# Altium footprint library HoangLong_Library.PcbLib: 81 footprints (part 2 of 6)
Each footprint in its own frame and in the unit in brackets; x right, y up, seen from the top. Pads: shape width x height; smd on the part's side, far side on the other; paste and mask are expansions set on the pad; w line width, h text height; cw(c..) or ccw(c..) is an arc to the next point about the centre after c.
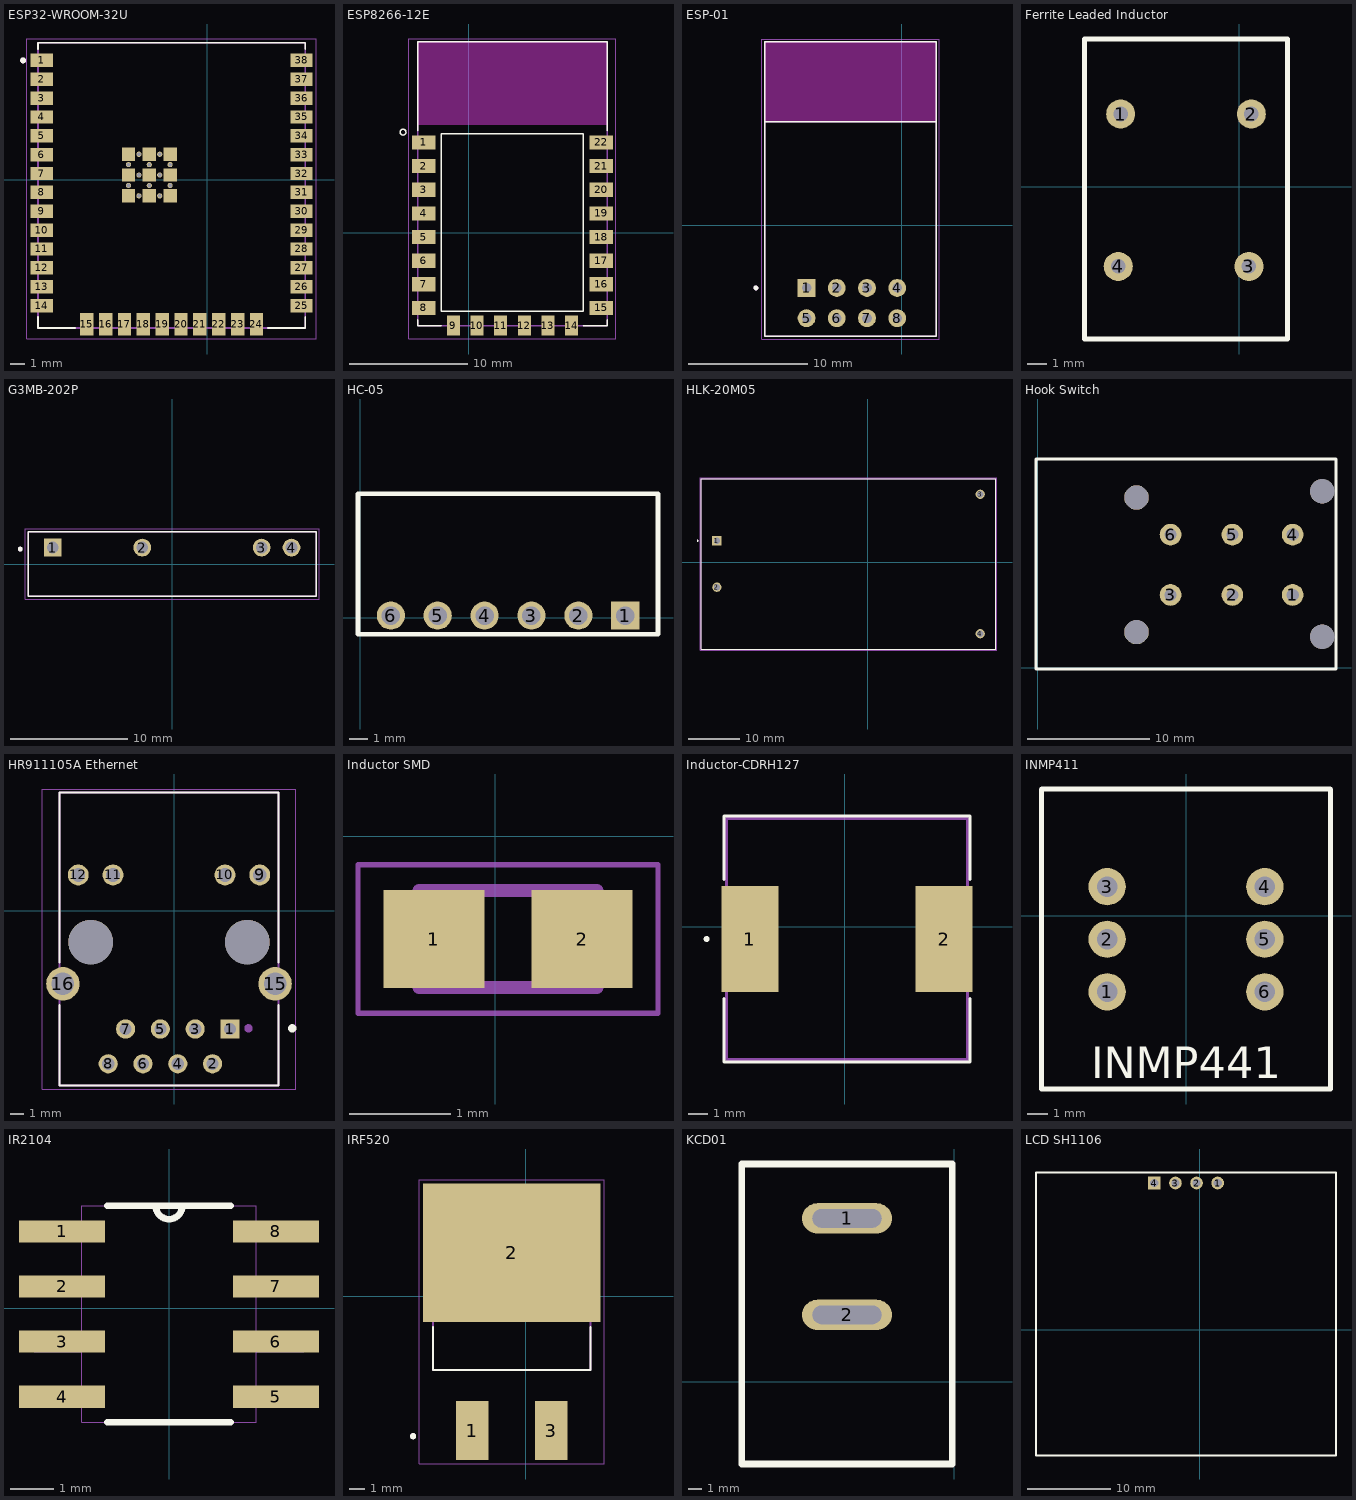
[diagram p1: the footprints below, top view; thin cyan lines are the x and y axes]

## ESP32-WROOM-32U [mm]
pads (59):
  rect 1.5x0.9 smd: 1(-11.163,8.029) 2(-11.163,6.759) 3(-11.163,5.489) 4(-11.163,4.219) 5(-11.163,2.949) 6(-11.163,1.679) 7(-11.163,0.409) 8(-11.163,-0.861) 9(-11.163,-2.131) 10(-11.163,-3.401) 11(-11.163,-4.671) 12(-11.163,-5.941) 13(-11.163,-7.211) 14(-11.163,-8.481) 25(6.337,-8.481) 26(6.337,-7.211) 27(6.337,-5.941) 28(6.337,-4.671) 29(6.337,-3.401) 30(6.337,-2.131) 31(6.337,-0.861) 32(6.337,0.409) 33(6.337,1.679) 34(6.337,2.949) 35(6.337,4.219) 36(6.337,5.489) 37(6.337,6.759) 38(6.337,8.029)
  rect 0.9x1.5 smd: 15(-8.128,-9.731) 16(-6.858,-9.731) 17(-5.588,-9.731) 18(-4.318,-9.731) 19(-3.048,-9.731) 20(-1.778,-9.731) 21(-0.508,-9.731) 22(0.762,-9.731) 23(2.032,-9.731) 24(3.302,-9.731)
  rect 0.9x0.9 smd: 39_1(-5.313,1.709) 39_2(-3.913,1.709) 39_3(-2.513,1.709) 39_4(-5.313,0.309) 39_5(-3.913,0.309) 39_6(-2.513,0.309) 39_7(-5.313,-1.091) 39_8(-3.913,-1.091) 39_9(-2.513,-1.091)
  round 0.35 hole 0.25 mask+0: 40_1(-4.613,1.709) 40_2(-3.213,1.709) 40_3(-5.313,1.009) 40_4(-3.913,1.009) 40_5(-2.513,1.009) 40_6(-4.613,0.309) 40_7(-3.213,0.309) 40_8(-5.313,-0.391) 40_9(-3.913,-0.391) 40_10(-2.513,-0.391) 40_11(-4.613,-1.091) 40_12(-3.213,-1.091)
Top Overlay:
  circle w0.2: c-12.413,8.029 r0.1
  lines w0.127: -11.413,-9.251 -11.413,-9.981 -8.898,-9.981 ; -11.413,8.799 -11.413,9.219 6.587,9.219 6.587,8.799 ; 4.072,-9.981 6.587,-9.981 6.587,-9.251
Mechanical 13:
  circle w0.2: c-12.413,8.029 r0.1
  lines w0.127: -11.413,-9.981 6.587,-9.981 6.587,9.219 -11.413,9.219 -11.413,-9.981
Mechanical 15:
  lines w0.05: -12.163,-10.731 7.337,-10.731 7.337,9.469 -12.163,9.469 -12.163,-10.731
3D body "step_temp.STEP": height 3.35, standoff 0, extent -11.413,-9.981 6.587,9.219

## ESP8266-12E [mm]
pads (22):
  rect 2x1.2 smd: 1(-3.817,7.635) 2(-3.817,5.635) 3(-3.817,3.635) 4(-3.817,1.635) 5(-3.817,-0.365) 6(-3.817,-2.365) 7(-3.817,-4.365) 8(-3.817,-6.365) 15(11.183,-6.365) 16(11.183,-4.365) 17(11.183,-2.365) 18(11.183,-0.365) 19(11.183,1.635) 20(11.183,3.635) 21(11.183,5.635) 22(11.183,7.635)
  rect 1.1x1.7 smd: 9(-1.317,-7.865) 10(0.683,-7.865) 11(2.683,-7.865) 12(4.683,-7.865) 13(6.683,-7.865) 14(8.683,-7.865)
Top Overlay:
  circle w0.127: c-5.567,8.51 r0.25
  lines w0.127: -4.317,-7.365 -4.317,-7.865 -2.317,-7.865 ; -4.317,8.635 -4.317,16.135 11.683,16.135 11.683,8.635 ; 9.683,-7.865 11.683,-7.865 11.683,-7.365 ; -2.317,-6.625 9.683,-6.625 9.683,8.375 -2.317,8.375 -2.317,-6.625
Keep-Out Layer:
  region: 11.683,9.145 -4.326,9.145 -4.326,16.135 11.683,16.135
  region: 11.683,9.145 -4.326,9.145 -4.326,16.135 11.683,16.135
Mechanical 13:
  lines w0.127: -4.317,-7.865 11.683,-7.865 11.683,16.135 -4.317,16.135 -4.317,-7.865
Mechanical 15:
  lines w0.05: -5.067,-8.99 12.433,-8.99 12.433,16.385 -5.067,16.385 -5.067,-8.99
3D body "step_temp.STEP": height 3, standoff 0, extent -4.317,-7.936 11.683,16.064

## ESP-01 [mm]
pads (8):
  rect 1.5x1.5 hole 0.8: 1(-8.001,-5.262)
  round 1.5 hole 0.8: 2(-5.461,-5.262) 3(-2.921,-5.262) 4(-0.381,-5.262) 5(-8.001,-7.802) 6(-5.461,-7.802) 7(-2.921,-7.802) 8(-0.381,-7.802)
Top Overlay:
  circle w0.2: c-12.251,-5.262 r0.1
  lines w0.127: -11.501,8.698 2.899,8.698 ; -11.501,8.698 -11.501,15.398 2.899,15.398 2.899,8.698 ; -11.501,8.698 -11.501,-9.302 2.899,-9.302 2.899,8.698
Keep-Out Layer:
  region: 2.899,8.698 -11.501,8.698 -11.501,15.398 2.899,15.398
Mechanical 13:
  circle w0.2: c-12.251,-5.262 r0.1
  lines w0.127: -11.501,8.698 2.899,8.698 ; -11.501,8.698 -11.501,15.398 2.899,15.398 2.899,8.698 ; -11.501,8.698 -11.501,-9.302 2.899,-9.302 2.899,8.698
Mechanical 15:
  lines w0.05: -11.751,-9.552 3.149,-9.552 3.149,15.648 -11.751,15.648 -11.751,-9.552
3D body "ESP8266-01_ESP-01.STEP": height 7.77, standoff -4.73, extent -11.518,-9.302 2.882,15.398

## Ferrite Leaded Inductor [mil]
pads (4):
  round 60 hole 30: 1(-245,150) 2(25,150) 3(20,-165) 4(-250,-165)
Top Overlay:
  lines w10: -320,-315 -320,305 100,305 100,-315 -320,-315
3D body "744862180.stp": height 671.32, standoff -106.3, extent -318.66,-314.01 98.66,304.01

## G3MB-202P [mm]
pads (4):
  rect 1.508x1.508 hole 1: 1(-10.16,1.4)
  round 1.508 hole 1: 2(-2.54,1.4) 3(7.62,1.4) 4(10.16,1.4)
Top Overlay:
  circle w0.2: c-12.93,1.27 r0.1
  lines w0.127: -12.25,-2.75 -12.25,2.75 12.25,2.75 12.25,-2.75 -12.25,-2.75
Mechanical 13:
  circle w0.2: c-12.93,1.27 r0.1
  lines w0.127: -12.25,-2.75 -12.25,2.75 12.25,2.75 12.25,-2.75 -12.25,-2.75
Mechanical 15:
  lines w0.05: -12.5,-3 12.5,-3 12.5,3 -12.5,3 -12.5,-3
3D body "G3MB-202P DC5.STEP": height 20.75, standoff -3.65, extent -12.25,-2.753 12.25,2.747

## HC-05 [mil]
pads (6):
  rect 60x60 hole 39.37: 1(565,5)
  round 60 hole 39.37: 2(465,5) 3(365,5) 4(265,5) 5(165,5) 6(65,5)
Top Overlay:
  lines w10: -5,-35 635,-35 635,265 -5,265 -5,-35
3D body "Bluetooth Module HC-05.STEP": height 1546.38, standoff -139.64, extent 0.04,-5 629.96,262.72

## HLK-20M05 [mm]
pads (4):
  rect 1.8x1.8 hole 1.2: 1(-29.183,4.119)
  round 1.8 hole 1.2: 2(-29.183,-4.881) 3(21.817,13.119) 4(21.817,-13.881)
Top Overlay:
  circle w0.2: c-32.933,4.119 r0.1
  lines w0.127: -32.183,-16.881 -32.183,16.119 24.817,16.119 24.817,-16.881 -32.183,-16.881
Mechanical 13:
  circle w0.2: c-32.933,4.119 r0.1
  lines w0.127: -32.183,-16.881 -32.183,16.119 24.817,16.119 24.817,-16.881 -32.183,-16.881
Mechanical 15:
  lines w0.05: -32.433,-17.131 -32.433,16.369 25.067,16.369 25.067,-17.131 -32.433,-17.131
3D body "HLK-20M05 v13.step": height 23.03, standoff -4.49, extent -32.284,-16.849 24.716,16.151

## Hook Switch [mil]
pads (10):
  round 70 hole 39.37: 1(825,235) 2(630,235) 3(430,235) 4(825,430) 5(630,430) 6(430,430)
  round 78.74 hole 78.74: ""(320,115) ""(320,550) ""(920,100) ""(920,570)
Top Overlay:
  lines w10: -5,-5 965,-5 965,675 -5,675 -5,-5
3D body "xb-hs-22l01.stp": height 356.54, standoff -76.54, extent -1.77,-2.87 962.8,670.35

## HR911105A Ethernet [mm]
pads (16):
  rect 1.398x1.398 / inner round 1.398 / far side rect 1.398x1.398 hole 0.89: 1(4.069,-8.636)
  round 1.398 hole 0.89: 2(2.799,-11.176) 3(1.529,-8.636) 4(0.259,-11.176) 5(-1.011,-8.636) 6(-2.281,-11.176) 7(-3.551,-8.636) 8(-4.821,-11.176)
  round 1.53 hole 1.02: 9(6.244,2.614) 10(3.704,2.614) 11(-4.466,2.614) 12(-7.006,2.614)
  round 2.445 hole 1.63: 15(7.364,-5.336) 16(-8.126,-5.336)
  round 3.25 hole 3.25 unplated: ""(-6.096,-2.286) ""(5.334,-2.286)
Top Overlay:
  circle w0.3: c8.619,-8.586 r0.15
  lines w0.127: -8.381,-6.886 -8.381,-12.766 7.619,-12.766 7.619,-6.886 ; -8.381,-3.786 -8.381,8.634 7.619,8.634 7.619,-3.786
Mechanical 13:
  circle w0.3: c5.419,-8.586 r0.15
  lines w0.127: -8.381,-12.766 7.619,-12.766 7.619,8.634 -8.381,8.634 -8.381,-12.766
Mechanical 15:
  lines w0.05: -9.631,-13.016 8.869,-13.016 8.869,8.884 -9.631,8.884 -9.631,-13.016
3D body "step_temp.STEP": height 13.5, standoff -3.05, extent -8.401,-12.684 7.639,8.616

## Inductor SMD [mm]
pads (2):
  rect 1x0.97 smd: 1(-0.608,-1.016) 2(0.862,-1.016)
Mechanical 13:
  lines w0.127: -0.753,-1.496 1.007,-1.496 1.007,-0.536 -0.753,-0.536 -0.753,-1.496
Mechanical 15:
  lines w0.05: -1.358,-1.751 1.612,-1.751 1.612,-0.281 -1.358,-0.281 -1.358,-1.751
3D body "LQM18PN1R0NF0L.STEP": height 0.8, standoff 0, extent -0.673,-1.458 0.927,-0.508

## Inductor-CDRH127 [mil]
pads (2):
  rect 114x213 smd: 1(-190,-25) 2(200,-25)
Top Overlay:
  lines w6: -242,-145 -242,-272 252,-272 252,-145 ; -242,95 -242,222 252,222 252,95 ; -280,-25 cw(c-277,-25) -274,-25 cw(c-277,-25) -280,-25
Mechanical 13:
  lines w0: -237,-25 cw(c-234,-25) -231,-25 cw(c-234,-25) -237,-25
  lines w6: -237,-267 -237,-25 -237,217 247,217 247,-267 -237,-267
3D body "step_temp.STEP": height 314.96, standoff 0, extent -231.22,-261.22 241.22,211.22

## INMP411 [mm]
pads (6):
  round 1.8 hole 1: 1(-3.81,-3.683) 2(-3.81,-1.143) 3(-3.81,1.397) 4(3.81,1.397) 5(3.81,-1.143) 6(3.81,-3.683)
Top Overlay:
  lines w0.254: -6.985,-8.382 -6.985,6.096 -6.961,6.12 6.961,6.12 6.985,6.096 6.985,-8.382 -6.985,-8.382
  text "INMP441" at -4.572,-7.874 h1.52
3D body "INMP441 I2S Microphone Module v15.step": height 8.09, standoff -3.16, extent -6.883,-8.263 6.883,5.977

## IR2104 [mil] "IR2104SPBF MOSFET 2 Ngõ Ra, 360 mA, 20V 8-SOIC"
pads (8):
  rect 78x20 smd: 1(-97,70) 2(-97,20) 3(-97,-30) 4(-97,-80) 5(97,-80) 6(97,-30) 7(97,20) 8(97,70)
Top Overlay:
  lines w6: -56,-103 56,-103 ; -56,93 -12,93 ; 56,93 12,93 ; -12,93 ccw(c0,93) 12,93 ; -12,93 12,93
Mechanical 13:
  lines w0: -12,93 ccw(c0,93) 12,93 ; -12,93 12,93 ; -12,93 -79,93 -79,-103 79,-103 79,93 12,93 ; -122,-89 -122,-71 -79,-71 -79,-89 -122,-89 ; -122,-39 -122,-21 -79,-21 -79,-39 -122,-39 ; -122,11 -122,29 -79,29 -79,11 -122,11 ; -122,61 -122,79 -79,79 -79,61 -122,61 ; 79,-89 79,-71 122,-71 122,-89 79,-89 ; 79,-39 79,-21 122,-21 122,-39 79,-39 ; 79,11 79,29 122,29 122,11 79,11 ; 79,61 79,79 122,79 122,61 79,61
3D body "IR2104SPBF.STEP": height 68.9, standoff 0, extent -118.11,-103.43 118.11,93.43

## IRF520 [mil] "SMD"
pads (3):
  rect 81.89x150 smd: 1(-135,-340) 3(65,-340)
  rect 450x350 smd paste-275.59: 2(-35,110)
Top Overlay:
  circle w7.87: c-285,-354.37 r3.94
  lines w5: -235,-77.6 -235,-187.34 165,-187.34 165,-77.6
Top Paste:
  region: 178.58,-47.48 127.4,-47.48 127.4,4.09 178.58,4.09
  region: 103.39,-47.48 52.2,-47.48 52.2,4.09 103.39,4.09
  region: 28.19,-47.48 -22.99,-47.48 -22.99,4.09 28.19,4.09
  region: -197.4,-47.48 -248.58,-47.48 -248.58,4.09 -197.4,4.09
  region: -122.2,-47.48 -173.39,-47.48 -173.39,4.09 -122.2,4.09
  region: -47.01,-47.48 -98.19,-47.48 -98.19,4.09 -47.01,4.09
  region: 178.58,215.91 127.4,215.91 127.4,267.48 178.58,267.48
  region: 103.39,215.91 52.2,215.91 52.2,267.48 103.39,267.48
  region: 28.19,215.91 -22.99,215.91 -22.99,267.48 28.19,267.48
  region: -197.4,215.91 -248.58,215.91 -248.58,267.48 -197.4,267.48
  region: -122.2,215.91 -173.39,215.91 -173.39,267.48 -122.2,267.48
  region: -47.01,215.91 -98.19,215.91 -98.19,267.48 -47.01,267.48
  region: 178.58,40.31 127.4,40.31 127.4,91.89 178.58,91.89
  region: 103.39,40.31 52.2,40.31 52.2,91.89 103.39,91.89
  region: 28.19,40.31 -22.99,40.31 -22.99,91.89 28.19,91.89
  region: -197.4,40.31 -248.58,40.31 -248.58,91.89 -197.4,91.89
  region: -122.2,40.31 -173.39,40.31 -173.39,91.89 -122.2,91.89
  region: -47.01,40.31 -98.19,40.31 -98.19,91.89 -47.01,91.89
  region: 178.58,128.11 127.4,128.11 127.4,179.69 178.58,179.69
  region: 103.39,128.11 52.2,128.11 52.2,179.69 103.39,179.69
  region: 28.19,128.11 -22.99,128.11 -22.99,179.69 28.19,179.69
  region: -197.4,128.11 -248.58,128.11 -248.58,179.69 -197.4,179.69
  region: -122.2,128.11 -173.39,128.11 -173.39,179.69 -122.2,179.69
  region: -47.01,128.11 -98.19,128.11 -98.19,179.69 -47.01,179.69
Mechanical 13:
  circle w7.87: c-285,-354.37 r3.94
  lines w5: -235,-187.34 -235,170.14 165,170.14 165,-187.34 -235,-187.34
Mechanical 15:
  lines w1.97: -269.84,-424.84 199.84,-424.84 199.84,294.84 -269.84,294.84 -269.84,-424.84
3D body "IRF520NSTRLPBF.STEP": height 198.6, standoff -1.33, extent -235,-365 165,235

## KCD01 [mm]
pads (2):
  oval 6.5x2.2 hole 1.35 slot 5 at 0 deg: 1(-7.747,11.811) 2(-7.747,4.826)
Top Overlay:
  lines w0.5: -15.367,-5.969 -15.367,15.748 -0.127,15.748 -0.127,-5.969 -15.367,-5.969
3D body "KCD1-B2-2P-Off.step": height 20.48, standoff -6, extent -15.247,-5.874 -0.247,15.526

## LCD SH1106 [mil]
pads (4):
  round 60 hole 39.37: 1(85,695) 2(-15,695) 3(-115,695)
  rect 60x60 hole 39.37: 4(-215,695)
Top Overlay:
  lines w10: -775,-595 645,-595 645,595 645,745 -775,745 -775,-595
3D body "Oled SH1106.SLDPRT": height 377.95, standoff -98.43, extent -773.66,-594.29 643.66,744.29